# Altium footprint library GCT_USB-A.PcbLib: 9 footprints
Each footprint in its own frame and in the unit in brackets; x right, y up, seen from the top. Pads: shape width x height; smd on the part's side, far side on the other; paste and mask are expansions set on the pad; w line width, h text height; cw(c..) or ccw(c..) is an arc to the next point about the centre after c.
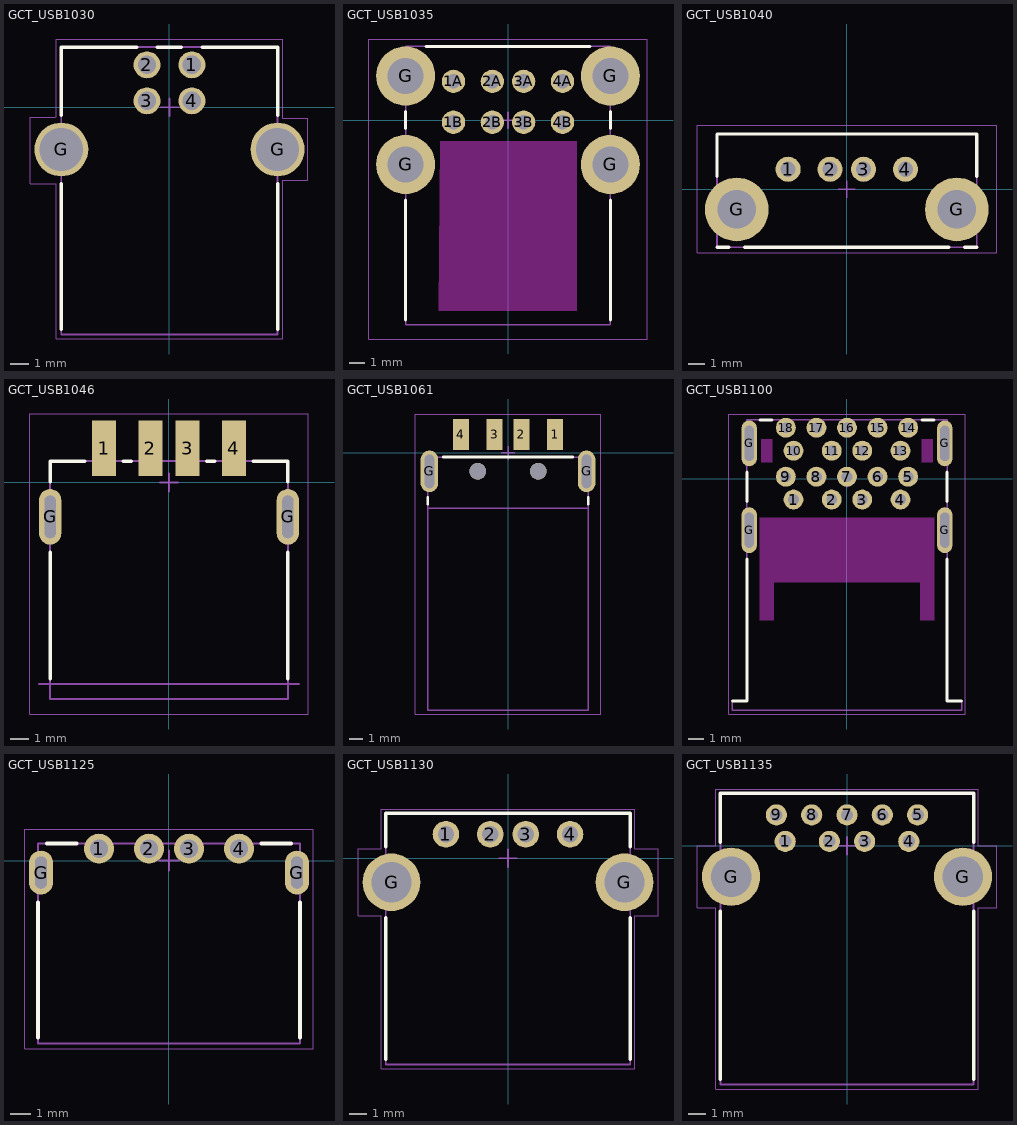
[diagram p0: the footprints below, top view; thin cyan lines are the x and y axes]

## GCT_USB1030 [mm]
height 10.95
pads (6):
  round 1.5 hole 1.02 mask+0.07: 1(1.25,2.355) 2(-1.25,2.355) 3(-1.25,0.355) 4(1.25,0.355)
  round 3 hole 2.4 mask+0.07: G(-6.02,-2.355) G(6.02,-2.355)
Top Overlay:
  lines w0.2: -6.02,-12.355 -6.02,-4.255 ; -6.02,-0.455 -6.02,3.345 -1.835,3.345 ; -0.665,3.345 0.665,3.345 ; 1.835,3.345 6.02,3.345 6.02,-0.455 ; 6.02,-12.355 6.02,-4.255
Top Assembly:
  lines w0.1: -6.02,-12.655 6.02,-12.655 6.02,3.345 -6.02,3.345 -6.02,-12.655
  text ".Designator" at -2.252,-0.226 h1
  text "PCB Edge" at 3.766,-12.373 h0.51
Top Courtyard:
  lines w0.05: -6.35,-0.555 -7.75,-0.555 -7.75,-4.255 -6.3,-4.255 -6.3,-12.905 6.3,-12.905 6.3,-4.055 7.7,-4.055 7.7,-0.605 6.3,-0.605 6.3,3.795 -6.3,3.795 -6.3,-0.555
  lines w0.1: -0.5,0 0.5,0 ; 0,-0.5 0,0.5
3D body "USB1030-15-P-B-B.stp": height 10.95, standoff -3.49, extent -7.092,-12.65 7.018,3.55

## GCT_USB1035 [mm]
height 15.32
pads (12):
  round 1.5 hole 0.92 mask+0.07: 1A(-3.5,2.49) 1B(-3.5,-0.13) 2A(-1,2.49) 2B(-1,-0.13) 3A(1,2.49) 3B(1,-0.13) 4A(3.5,2.49) 4B(3.5,-0.13)
  round 3.8 hole 2.3 mask+0.07: G(-6.57,-2.84) G(-6.57,2.84) G(6.57,-2.84) G(6.57,2.84)
Top Layer keep-out:
  region: -4.349,-1.34 4.4,-1.34 4.4,-12.24 -4.452,-12.24
Top Overlay:
  lines w0.2: -6.57,-12.82 -6.57,-5.14 ; -6.57,-0.54 -6.57,0.54 ; -5.274,4.74 5.274,4.74 ; 6.57,-12.82 6.57,-5.14 ; 6.57,-0.54 6.57,0.54
Top Assembly:
  lines w0.1: -6.57,-13.12 6.57,-13.12 6.57,4.74 -6.57,4.74 -6.57,-13.12
  text "PCB Edge" at 4.366,-12.858 h0.51
  text ".Designator" at -2.252,-0.226 h1
Top Courtyard:
  lines w0.05: -8.941,-14.041 8.941,-14.041 8.941,5.212 -8.941,5.212 -8.941,-14.041
  lines w0.1: -0.5,0 0.5,0 ; 0,-0.5 0,0.5
3D body "step_temp.STEP": height 16.09, standoff -3.8, extent -7.865,-13.12 7.865,3.88

## GCT_USB1040 [mm]
height 13.7
pads (6):
  round 1.5 hole 0.9 mask+0.07: 1(-3.5,1.2) 2(-1,1.2) 3(1,1.2) 4(3.5,1.2)
  round 3.8 hole 2.3 mask+0.07: G(-6.57,-1.2) G(6.57,-1.2)
Top Overlay:
  lines w0.2: -7.75,-3.45 -7.047,-3.45 ; -7.75,0.774 -7.75,3.3 7.75,3.3 7.75,0.774 ; -6.093,-3.45 6.093,-3.45 ; 7.047,-3.45 7.75,-3.45
Top Assembly:
  lines w0.1: -7.75,-3.45 7.75,-3.45 7.75,3.3 -7.75,3.3 -7.75,-3.45
  text ".Designator" at -2.252,-0.226 h1
Top Courtyard:
  lines w0.05: -8.941,-3.791 -8.941,3.829 8.966,3.829 8.966,-3.791 -8.941,-3.791
  lines w0.1: -0.5,0 0.5,0 ; 0,-0.5 0,0.5
3D body "USB1040-15-L-B.stp": height 13.7, standoff -3.5, extent -7.822,-3.6 7.772,3.52

## GCT_USB1046 [mm]
height 6.95
pads (6):
  rect 1.3x3 smd mask+0.07: 1(-3.5,1.85) 2(-1,1.85) 3(1,1.85) 4(3.5,1.85)
  oval 1.2x3 hole 0.6 slot 2.3 at 90 deg mask+0.07: G(-6.4,-1.85) G(6.4,-1.85)
Top Overlay:
  lines w0.2: -6.4,-10.55 -6.4,-3.75 ; -6.4,0.05 -6.4,1.15 -4.55,1.15 ; -2.45,1.15 -2.05,1.15 ; 2.05,1.15 2.45,1.15 ; 4.55,1.15 6.4,1.15 6.4,0.05 ; 6.4,-10.55 6.4,-3.75
Top Assembly:
  lines w0.1: -7,-10.85 7,-10.85 ; -6.4,-10.85 -6.4,1.15 6.4,1.15 6.4,-10.85
  text ".Designator" at -2.252,-0.226 h1
Top Courtyard:
  lines w0.05: -7.493,-12.467 7.493,-12.467 7.493,3.687 -7.493,3.687 -7.493,-12.467
  lines w0.1: -0.5,0 0.5,0 ; 0,-0.5 0,0.5
Assembly Notes:
  lines w0.1: -7,-10.85 7,-10.85 ; -6.4,-10.85 -6.4,-11.65 6.4,-11.65 6.4,-10.85
  text "PCB Edge" at 4.166,-10.668 h0.51
3D body "step_temp.STEP": height 7.65, standoff -1.9, extent -7.25,-12.13 7.25,2.67

## GCT_USB1061 [mm]
height 4.6
pads (8):
  rect 1.2x2.3 smd mask+0.07: 1(3.5,1.375) 2(1,1.375) 3(-1,1.375) 4(-3.5,1.375)
  oval 1.3x3.1 hole 0.7 slot 2.5 at 90 deg mask+0.07: G(-5.85,-1.375) G(5.85,-1.375)
  round 1.25 hole 1.25 unplated mask+0.07: ""(-2.25,-1.375) ""(2.25,-1.375)
Top Overlay:
  lines w0.2: -5.969,-3.825 -5.969,-3.318 ; -4.813,-0.308 4.813,-0.308 ; 5.969,-3.825 5.969,-3.318
Top Assembly:
  lines w0.1: -5.969,-4.125 5.969,-4.125 5.969,-0.308 -5.969,-0.308 -5.969,-4.125
  text ".Designator" at -2.252,-0.226 h1
Top Courtyard:
  lines w0.05: -6.909,-19.434 -6.909,2.892 6.909,2.892 6.909,-19.434 -6.909,-19.434
  lines w0.1: -0.5,0 0.5,0 ; 0,-0.5 0,0.5
Assembly Notes:
  lines w0.1: 5.969,-19.155 -5.969,-19.155 -5.969,-4.125 5.969,-4.125 5.969,-19.155
  text "PCB Edge" at 3.766,-3.893 h0.51
3D body "USB1061-GF-L-A--3DModel-STEP-269445.STEP": height 3.07, standoff -2.88, extent -6.35,-19.15 6.35,2.13

## GCT_USB1100 [mm]
height 14.84
pads (22):
  round 1.3 hole 0.7 mask+0.07: 1(-3.5,-1.35) 2(-1,-1.35) 3(1,-1.35) 4(3.5,-1.35) 5(4,0.15) 6(2,0.15) 7(0,0.15) 8(-2,0.15) 9(-4,0.15) 10(-3.5,1.85) 11(-1,1.85) 12(1,1.85) 13(3.5,1.85) 14(4,3.35) 15(2,3.35) 16(0,3.35) 17(-2,3.35) 18(-4,3.35)
  oval 1x3 hole 0.6 slot 2.3 at 90 deg mask+0.07: G(-6.4,-3.35) G(-6.4,2.33) G(6.4,-3.35) G(6.4,2.33)
Top Layer keep-out:
  region: 5.7,-9.25 4.8,-9.25 4.8,-6.75 -4.8,-6.75 -4.8,-9.25 -5.7,-9.25 -5.7,-2.55 5.7,-2.55
  region: 5.6,1.1 4.9,1.1 4.9,2.6 5.6,2.6
  region: -4.9,1.1 -5.6,1.1 -5.6,2.6 -4.9,2.6
Top Overlay:
  lines w0.2: -7.5,-14.52 -6.55,-14.52 -6.55,-5.237 ; -6.55,-1.463 -6.55,0.443 ; -5.68,3.87 -4.912,3.87 ; 4.912,3.87 5.68,3.87 ; 6.55,-5.237 6.55,-14.52 7.5,-14.52 ; 6.55,-1.463 6.55,0.443
Top Assembly:
  lines w0.1: -7.5,-15.13 7.5,-15.13 7.5,-14.52 6.55,-14.52 6.55,3.87 -6.55,3.87 -6.55,-14.52 -7.5,-14.52 -7.5,-15.13
  text ".Designator" at -2.252,-0.226 h1
  text "PCB Edge" at 4.266,-14.868 h0.51
Top Courtyard:
  lines w0.05: -7.75,-15.38 7.75,-15.38 7.75,4.25 -7.75,4.25 -7.75,-15.38
  lines w0.1: -0.5,0 0.5,0 ; 0,-0.5 0,0.5
3D body "usb1100-30-a.stp": height 15.94, standoff -1.94, extent -7.487,-15.106 7.513,3.894

## GCT_USB1125 [mm]
height 6.63
pads (6):
  round 1.5 hole 0.92 mask+0.07: 1(-3.5,0.6) 2(-1,0.6) 3(1,0.6) 4(3.5,0.6)
  oval 1.2x2.2 hole 0.6 slot 1.6 at 90 deg mask+0.07: G(-6.4,-0.6) G(6.4,-0.6)
Top Overlay:
  lines w0.2: -6.55,-8.85 -6.55,-2.089 ; -6.088,0.85 -4.623,0.85 ; 4.623,0.85 6.088,0.85 ; 6.55,-8.85 6.55,-2.089
Top Assembly:
  lines w0.1: -6.55,-9.15 -6.55,0.85 6.55,0.85 6.55,-9.15 -6.55,-9.15
  text ".Designator" at -2.252,-0.226 h1
  text "PCB Edge" at 4.366,-8.918 h0.51
Top Courtyard:
  lines w0.05: -7.205,-9.4 -7.205,1.565 7.205,1.565 7.205,-9.4 -7.205,-9.4
  lines w0.1: -0.5,0 0.5,0 ; 0,-0.5 0,0.5
3D body "usb1125-gf-b.stp": height 6.46, standoff -2.55, extent -6.55,-9.15 6.55,0.85

## GCT_USB1130 [mm]
height 7
pads (6):
  round 1.5 hole 0.92 mask+0.07: 1(-3.5,1.355) 2(-1,1.355) 3(1,1.355) 4(3.5,1.355)
  round 3.25 hole 2.26 mask+0.07: G(-6.57,-1.355) G(6.57,-1.355)
Top Overlay:
  lines w0.2: -6.9,-11.335 -6.9,-3.353 ; -6.9,0.643 -6.9,2.525 6.9,2.525 6.9,0.643 ; 6.9,-11.335 6.9,-3.353
Top Assembly:
  lines w0.1: -6.9,-11.635 -6.9,2.525 6.9,2.525 6.9,-11.635 -6.9,-11.635
  text ".Designator" at -2.252,-0.226 h1
  text "PCB Edge" at 4.666,-11.373 h0.51
Top Courtyard:
  lines w0.05: -8.46,-3.255 -7.15,-3.255 -7.15,-11.885 7.15,-11.885 7.15,-3.255 8.46,-3.255 8.46,0.545 7.15,0.545 7.15,2.775 -7.15,2.775 -7.15,0.545 -8.46,0.545 -8.46,-3.255
  lines w0.1: -0.5,0 0.5,0 ; 0,-0.5 0,0.5
3D body "step_temp.STEP": height 6.99, standoff -3.22, extent -7.799,-11.635 7.799,2.525

## GCT_USB1135 [mm]
height 7.2
pads (11):
  round 1.2 hole 0.7 mask+0.07: 1(-3.5,0.25) 2(-1,0.25) 3(1,0.25) 4(3.5,0.25) 5(4,1.75) 6(2,1.75) 7(0,1.75) 8(-2,1.75) 9(-4,1.75)
  round 3.3 hole 2.3 mask+0.07: G(-6.57,-1.75) G(6.57,-1.75)
Top Overlay:
  lines w0.2: -7.175,-13.23 -7.175,-3.709 ; -7.175,0.209 -7.175,2.97 7.175,2.97 7.175,0.209 ; 7.175,-13.23 7.175,-3.709
Top Assembly:
  lines w0.1: -7.175,-13.53 7.175,-13.53 7.175,2.97 -7.175,2.97 -7.175,-13.53
  text "PCB Edge" at 4.966,-13.268 h0.51
  text ".Designator" at -2.252,-0.226 h1
Top Courtyard:
  lines w0.05: -8.48,-3.5 -7.425,-3.5 -7.425,-13.78 7.425,-13.78 7.425,-3.5 8.48,-3.5 8.48,0 7.425,0 7.425,3.22 -7.425,3.22 -7.425,0 -8.48,0 -8.48,-3.5
  lines w0.1: -0.5,0 0.5,0 ; 0,-0.5 0,0.5
3D body "USB1135-15-P-L-B.stp": height 7.56, standoff -3.84, extent -7.736,-13.525 7.735,2.975